# Altium footprint library PCB_CONNECTORS.PcbLib: 676 footprints (part 6 of 43)
Each footprint in its own frame and in the unit in brackets; x right, y up, seen from the top. Pads: shape width x height; smd on the part's side, far side on the other; paste and mask are expansions set on the pad; w line width, h text height; cw(c..) or ccw(c..) is an arc to the next point about the centre after c.
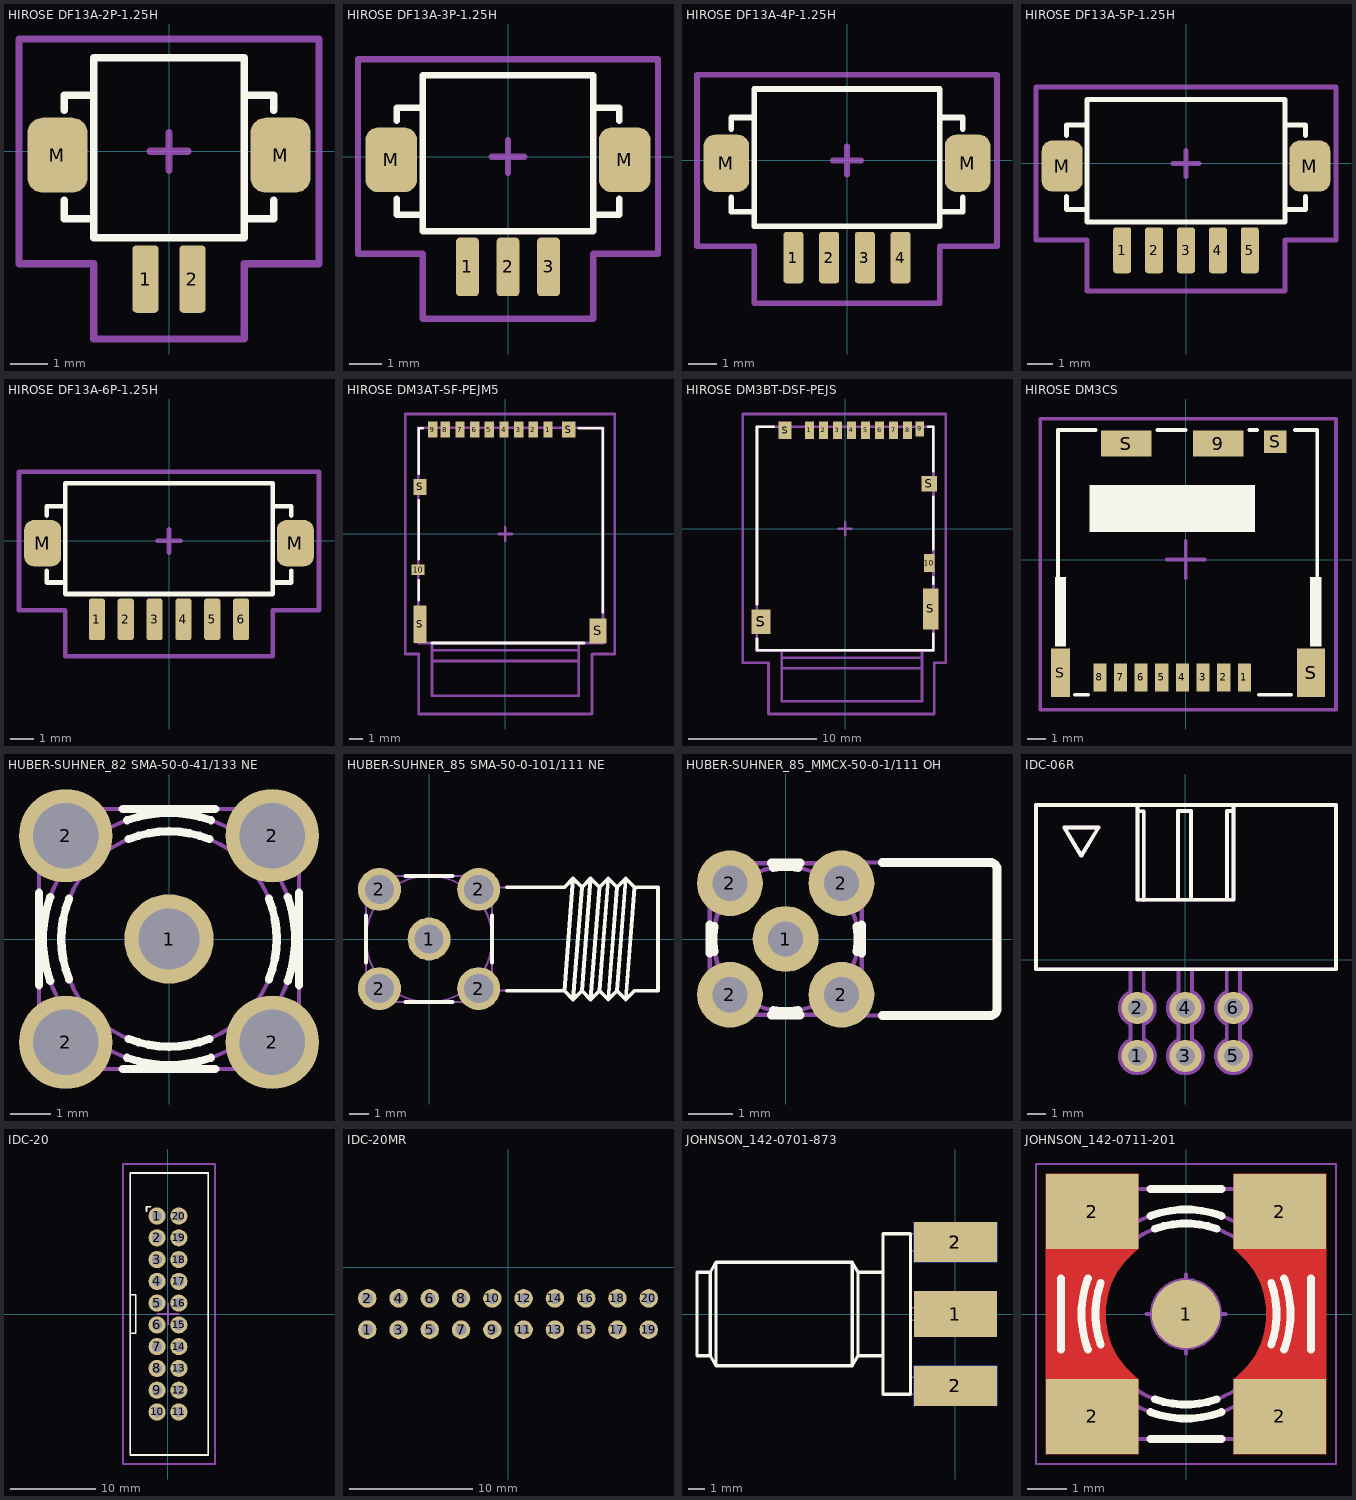
[diagram p5: the footprints below, top view; thin cyan lines are the x and y axes]

## HIROSE DF13A-2P-1.25H [mm] "DF13 Series 1.25mm pitch miniature crimping connector single row"
height 3.6
pads (4):
  rrect30% 0.7x1.8 smd: 1(-0.625,-3.4) 2(0.625,-3.4)
  rrect50% 1.6x2 smd: M(-2.975,-0.1) M(2.975,-0.1)
Top Overlay:
  lines w0.2: -2.8,-1.3 -2.8,-1.8 -2.4,-1.8 -2,-1.8 ; -2.8,1.1 -2.8,1.5 -2,1.5 ; 2,-1.9 2,-1.8 2.4,-1.8 2.8,-1.8 2.8,-1.3 ; 2,1.5 2.8,1.5 2.8,1.1 ; -2,-2.3 -2,-1.3 -2,2.5 0,2.5 2,2.5 2,-1.3 2,-2.3 1,-2.3 0,-2.3 -1,-2.3 -2,-2.3
Mechanical 15:
  lines w0.2: -0.5,0 0.5,0 ; 0,-0.5 0,0.5 ; -4,-3 -2,-3 -2,-5 0,-5 2,-5 2,-3 4,-3 4,2.5 4,3 0,3 -4,3 -4,2.5 -4,-3
3D body "DF13-2P-1.25H_X_8A_S_H_X_97_S__.STEP": height 3.59, standoff -0.01, extent -3.575,-3.9 3.575,2.6

## HIROSE DF13A-3P-1.25H [mm] "DF13 Series 1.25mm pitch miniature crimping connector single row"
height 3.6
pads (5):
  rrect30% 0.7x1.8 smd: 1(-1.25,-3.4) 2(0,-3.4) 3(1.25,-3.4)
  rrect50% 1.6x2 smd: M(-3.6,-0.1) M(3.6,-0.1)
Top Overlay:
  lines w0.2: -3.425,-1.3 -3.425,-1.8 -3.025,-1.8 -2.625,-1.8 ; -3.425,1.1 -3.425,1.5 -2.625,1.5 ; 2.625,1.5 3.425,1.5 3.425,1.1 ; 3.425,-1.3 3.425,-1.8 3.025,-1.8 2.625,-1.8 ; -2.625,-1.8 -2.625,-1.3 -2.625,2.5 -0.625,2.5 1.375,2.5 2.625,2.5 2.625,-1.3 2.625,-1.8 ; -2.625,-1.8 -2.625,-2.3 -1.625,-2.3 -0.625,-2.3 0,-2.3 0.625,-2.3 1.625,-2.3 2.625,-2.3 2.625,-1.8
Mechanical 15:
  lines w0.2: -0.5,0 0.5,0 ; 0,-0.5 0,0.5 ; -4.625,-3 -2.625,-3 -2.625,-5 -0.625,-5 2.625,-5 2.625,-3 4.625,-3 4.625,2.5 4.625,3 3.375,3 -0.625,3 -4.625,3 -4.625,2.5 -4.625,-3
3D body "DF13-3P-1.25H_X_8A_S_H_X_97_S__.STEP": height 3.59, standoff -0.01, extent -4.2,-3.9 4.2,2.6

## HIROSE DF13A-4P-1.25H [mm] "DF13 Series 1.25mm pitch miniature crimping connector single row"
height 3.6
pads (6):
  rrect30% 0.7x1.8 smd: 1(-1.875,-3.4) 2(-0.625,-3.4) 3(0.625,-3.4) 4(1.875,-3.4)
  rrect50% 1.6x2 smd: M(-4.225,-0.1) M(4.225,-0.1)
Top Overlay:
  lines w0.2: -4.05,-1.3 -4.05,-1.8 -3.65,-1.8 -3.25,-1.8 ; -4.05,1.1 -4.05,1.5 -3.25,1.5 ; 3.25,1.5 4.05,1.5 4.05,1.1 ; 4.05,-1.3 4.05,-1.8 3.65,-1.8 3.25,-1.8 ; -3.25,-1.8 -3.25,-1.3 -3.25,2.5 -1.25,2.5 2,2.5 3.25,2.5 3.25,-1.3 3.25,-1.8 ; -3.25,-1.8 -3.25,-2.3 -2.25,-2.3 -1.25,-2.3 -0.625,-2.3 1.25,-2.3 2.25,-2.3 3.25,-2.3 3.25,-1.8
Mechanical 15:
  lines w0.2: -0.5,0 0.5,0 ; 0,-0.5 0,0.5 ; -5.25,-3 -5.25,2.5 -5.25,3 -1.25,3 4,3 5.25,3 5.25,2.5 5.25,-3 3.25,-3 3.25,-5 -1.25,-5 -3.25,-5 -3.25,-3 -5.25,-3
3D body "DF13A-4P-1.25H_X_8A_S_H_X_97_S__.STEP": height 3.59, standoff -0.01, extent -4.825,-3.9 4.825,2.6

## HIROSE DF13A-5P-1.25H [mm] "DF13 Series 1.25mm pitch miniature crimping connector single row"
height 3.6
pads (7):
  rrect30% 0.7x1.8 smd: 1(-2.5,-3.4) 2(-1.25,-3.4) 3(0,-3.4) 4(1.25,-3.4) 5(2.5,-3.4)
  rrect50% 1.6x2 smd: M(-4.85,-0.1) M(4.85,-0.1)
Top Overlay:
  lines w0.2: -4.675,-1.3 -4.675,-1.8 -4.275,-1.8 -3.875,-1.8 ; -4.675,1.1 -4.675,1.5 -3.875,1.5 ; 3.875,1.5 4.675,1.5 4.675,1.1 ; 4.675,-1.3 4.675,-1.8 4.275,-1.8 3.875,-1.8 ; -3.875,-1.8 -3.875,-2.3 -2.875,-2.3 -1.875,-2.3 -1.25,-2.3 1.875,-2.3 2.875,-2.3 3.875,-2.3 3.875,-1.8 ; -3.875,-1.8 -3.875,-1.3 -3.875,2.5 -1.875,2.5 2.625,2.5 3.875,2.5 3.875,-1.3 3.875,-1.8
Mechanical 15:
  lines w0.2: -0.5,0 0.5,0 ; 0,-0.5 0,0.5 ; -5.875,-3 -3.875,-3 -3.875,-5 -1.875,-5 3.875,-5 3.875,-3 5.875,-3 5.875,2.5 5.875,3 4.625,3 -1.875,3 -5.875,3 -5.875,2.5 -5.875,-3
3D body "DF13A-5P-1.25H_X_8A_S_H_X_97_S__.STEP": height 3.59, standoff -0.01, extent -5.45,-3.9 5.45,2.6

## HIROSE DF13A-6P-1.25H [mm] "DF13 Series 1.25mm pitch miniature crimping connector single row"
height 3.6
pads (8):
  rrect30% 0.7x1.8 smd: 1(-3.125,-3.4) 2(-1.875,-3.4) 3(-0.625,-3.4) 4(0.625,-3.4) 5(1.875,-3.4) 6(3.125,-3.4)
  rrect50% 1.6x2 smd: M(-5.475,-0.1) M(5.475,-0.1)
Top Overlay:
  lines w0.2: -5.3,-1.3 -5.3,-1.8 -4.9,-1.8 -4.5,-1.8 ; -5.3,1.1 -5.3,1.5 -4.5,1.5 ; 4.5,-1.8 4.9,-1.8 5.3,-1.8 5.3,-1.3 ; 4.5,1.5 5.3,1.5 5.3,1.1 ; -4.5,-2.3 -4.5,-1.3 -4.5,2.5 -2.5,2.5 3.25,2.5 4.5,2.5 4.5,-1.3 4.5,-2.3 3.5,-2.3 1.8,-2.3 -1.875,-2.3 -2.5,-2.3 -3.5,-2.3 -4.5,-2.3
Mechanical 15:
  lines w0.2: -0.5,0 0.5,0 ; 0,-0.5 0,0.5 ; -6.5,-3 -6.5,2.5 -6.5,3 -2.5,3 5.25,3 6.5,3 6.5,2.5 6.5,-3 4.5,-3 4.5,-5 -2.5,-5 -4.5,-5 -4.5,-3 -6.5,-3
3D body "DF13A-6P-1.25H_X_8A_S_H_X_97_S__.STEP": height 3.59, standoff -0.01, extent -6.075,-3.9 6.075,2.6

## HIROSE DM3AT-SF-PEJM5 [mm]
height 1.68
pads (14):
  rect 0.7x1.2 smd: 1(3.2,7.825) 2(2.1,7.825) 3(1,7.825) 4(-0.1,7.825) 5(-1.2,7.825) 6(-2.3,7.825) 7(-3.4,7.825) 8(-4.5,7.825) 9(-5.45,7.825)
  rect 1x0.8 smd: 10(-6.55,-2.675)
  rect 1x2.8 smd: S(-6.4,-6.775)
  rect 1x1.2 smd: S(-6.4,3.525) S(4.75,7.825)
  rect 1.3x1.9 smd: S(6.95,-7.275)
Top Overlay:
  lines w0.2: -6.5,-4.975 -6.5,-3.475 ; -6.5,-1.875 -6.5,2.525 ; -6.5,4.525 -6.5,7.925 -6.2,7.925 ; -5.5,-8.175 5.9,-8.175 ; 5.5,7.925 7.3,7.925 7.3,-5.875
Mechanical 13:
  lines w0.2: -5.5,-8.725 5.5,-8.725 ; -5.5,-8.175 -5.5,-9.525 ; 5.5,-8.175 5.5,-9.525 ; -5.5,-9.525 -5.5,-12.125 5.5,-12.125 5.5,-9.525 ; -5.5,-9.525 5.5,-9.525 ; -6.525,-8.175 -6.525,7.975 7.325,7.975 7.325,-8.175 -6.525,-8.175
Mechanical 15:
  lines w0.2: -0.5,0 0.5,0 ; 0,-0.5 0,0.5 ; -7.5,-9 -6.5,-9 -6.5,-13.5 6.5,-13.5 6.5,-9 8.2,-9 8.2,-8 8.2,9 -7.5,9 -7.5,-8.5 -7.5,-9
3D body "Hirose DM3AT-SF-PEJM5.STEP": height 1.68, standoff 0, extent -6.525,-8.175 7.325,7.975

## HIROSE DM3BT-DSF-PEJS [mm]
height 2.38
pads (14):
  rect 0.7x1.4 smd: 1(-2.8,7.725) 2(-1.7,7.725) 3(-0.6,7.725) 4(0.5,7.725) 5(1.6,7.725) 6(2.7,7.725) 7(3.8,7.725) 8(4.9,7.725)
  rect 0.7x1.2 smd: 9(5.85,7.825)
  rect 0.8x1.4 smd: 10(6.6,-2.675)
  rect 1.5x1.9 smd: S(-6.6,-7.275)
  rect 1x1.4 smd: S(-4.7,7.725)
  rect 1.2x1.2 smd: S(6.6,3.525)
  rect 1.2x3.2 smd: S(6.7,-6.275)
Top Overlay:
  lines w0.2: -6.9,-8.6 -6.9,-9.5 6.9,-9.5 6.9,-8.2 ; -6.9,-5.9 -6.9,8 -5.6,8 ; 6.5,8 6.9,8 6.9,4.5 ; 6.9,-4.3 6.9,-3.8 ; 6.9,-1.6 6.9,2.5
Mechanical 13:
  lines w0.2: -4.975,-10.1 6.025,-10.1 ; -4.975,-9.55 -4.975,-10.9 ; 6.025,-9.55 6.025,-10.9 ; -4.975,-10.9 6.025,-10.9 ; -4.975,-10.9 -4.975,-13.5 6.025,-13.5 6.025,-10.9 ; -6.925,-9.55 6.925,-9.55 6.925,8 -6.925,8 -6.925,-9.55
Mechanical 15:
  lines w0.2: -0.5,0 0.5,0 ; 0,-0.5 0,0.5 ; -8,-10.5 -6,-10.5 -6,-14.5 7,-14.5 7,-10.5 7.9,-10.5 7.9,9 -8,9 -8,-10.5
3D body "Hirose DM3BT-DSF-PEJS.STEP": height 1.83, standoff 0, extent -6.925,-9.55 6.925,8

## HIROSE DM3CS [mm]
height 1.83
pads (13):
  rect 0.7x1.5 smd: 1(3.125,-6.275) 2(2.025,-6.275) 3(0.925,-6.275) 4(-0.175,-6.275) 5(-1.275,-6.275) 6(-2.375,-6.275) 7(-3.475,-6.275) 8(-4.575,-6.275)
  rect 2.7x1.4 smd: 9(1.725,6.175) S(-3.175,6.175)
  rect 1x2.6 smd: S(-6.675,-6.025)
  rect 1.2x1.2 smd: S(4.775,6.275)
  rect 1.5x2.6 smd: S(6.675,-6.025)
Top Overlay:
  rectangle: 6.625,-4.625 7.225,-0.925
  rectangle: -6.975,-4.625 -6.375,-0.925
  rectangle: -5.125,1.475 3.675,3.975
  lines w0.2: -6.7,-4.4 -6.8,-4.3 -6.8,6.9 -4.8,6.9 ; -5.9,-7.2 -5.2,-7.2 ; -1.5,6.9 0,6.9 ; 3.4,6.9 3.8,6.9 ; 3.9,-7.2 5.6,-7.2 ; 5.8,6.9 7,6.9 7,-4.4
Mechanical 15:
  lines w0.2: -1,0 1,0 ; 0,-1 0,1 ; -7.75,-8 -7.75,7.5 8,7.5 8,-8 -7.75,-8
3D body "Hirose DM3CS-SF.STEP": height 1.93, standoff 0, extent -6.8,-7.2 7,6.9

## HUBER-SUHNER_82 SMA-50-0-41/133 NE [mm] "50 Ohm SMA Straight PCB Jack"
height 9.5
pads (5):
  round 2.2 hole 1.5: 1(0,0)
  round 2.3 hole 1.6: 2(-2.54,-2.54) 2(-2.54,2.54) 2(2.54,-2.54) 2(2.54,2.54)
Top Overlay:
  lines w0.2: -3.2,-1.138 -3.2,1.138 ; -2.921,-1.038 cw(c0,0) -2.921,1.038 ; -2.457,-0.992 cw(c0,0) -2.457,0.992 ; -1.138,-3.2 1.138,-3.2 ; -1.138,3.2 1.138,3.2 ; -1.038,-2.921 ccw(c0,0) 1.038,-2.921 ; -1.038,2.921 cw(c0,0) 1.038,2.921 ; -0.992,-2.457 ccw(c0,0) 0.992,-2.457 ; -0.992,2.457 cw(c0,0) 0.992,2.457 ; 2.457,-0.992 ccw(c0,0) 2.457,0.992 ; 2.921,-1.038 ccw(c0,0) 2.921,1.038 ; 3.2,-1.138 3.2,1.138
Mechanical 8:
  lines w0.1: -3.54,-2.54 -2.54,-2.54 ; -3.54,2.54 -2.54,2.54 ; -2.54,-3.54 -2.54,-2.54 ; -2.54,-1.54 -2.54,-2.54 ; -2.54,1.54 -2.54,2.54 ; -2.54,3.54 -2.54,2.54 ; -1.54,-2.54 -2.54,-2.54 ; -1.54,2.54 -2.54,2.54 ; -1,0 0,0 ; 0,-1 0,0 ; 0,1 0,0 ; 1,0 0,0 ; 1.54,-2.54 2.54,-2.54 ; 1.54,2.54 2.54,2.54 ; 2.54,-3.54 2.54,-2.54 ; 2.54,-1.54 2.54,-2.54 ; 2.54,1.54 2.54,2.54 ; 2.54,3.54 2.54,2.54 ; 3.54,-2.54 2.54,-2.54 ; 3.54,2.54 2.54,2.54
Mechanical 14:
  circle w0.1: c0,0 r0.5
  circle w0.1: c0,0 r2.65
  circle w0.1: c0,0 r3.1
  lines w0.1: -3.2,-3.2 -3.2,3.2 3.2,3.2 3.2,-3.2 -3.2,-3.2
3D body "HUBER-SUHNER_82 SMA-50-0-41-133 NE.stp": height 9.5, standoff -4, extent -3.2,-3.2 3.2,3.2

## HUBER-SUHNER_85 SMA-50-0-101/111 NE [mm] "50 Ohm SMA Right Angle PCB Jack"
height 9.6
pads (5):
  round 2.2 hole 1.5: 1(0,0) 2(-2.54,-2.54) 2(-2.54,2.54) 2(2.54,-2.54) 2(2.54,2.54)
Top Overlay:
  lines w0.2: -3.23,-1.208 -3.23,1.208 ; -1.208,-3.23 1.208,-3.23 ; -1.208,3.23 1.208,3.23 ; 3.23,-1.208 3.23,1.208 ; 4,-2.65 6.93,-2.65 ; 4,2.65 6.93,2.65 7.38,3.1 ; 6.93,-2.65 7.38,3.1 ; 6.93,-2.65 7.38,-3.1 ; 7.38,-3.1 7.83,2.65 ; 7.38,-3.1 7.83,-2.65 ; 7.38,3.1 7.83,2.65 ; 7.83,-2.65 8.28,3.1 ; 7.83,-2.65 8.28,-3.1 ; 7.83,2.65 8.28,3.1 ; 8.28,-3.1 8.73,2.65 ; 8.28,-3.1 8.73,-2.65 ; 8.28,3.1 8.73,2.65 ; 8.73,-2.65 9.18,3.1 ; 8.73,-2.65 9.18,-3.1 ; 8.73,2.65 9.18,3.1 ; 9.18,-3.1 9.63,2.65 ; 9.18,-3.1 9.63,-2.65 ; 9.18,3.1 9.63,2.65 ; 9.63,-2.65 10.08,3.1 ; 9.63,-2.65 10.08,-3.1 ; 9.63,2.65 10.08,3.1 ; 10.08,-3.1 10.53,2.65 ; 10.08,-3.1 10.53,-2.65 11.73,-2.65 11.73,2.65 10.53,2.65 ; 10.08,3.1 10.53,2.65
Mechanical 8:
  lines w0.1: -3.54,-2.54 -2.54,-2.54 ; -3.54,2.54 -2.54,2.54 ; -2.54,-3.54 -2.54,-2.54 ; -2.54,-1.54 -2.54,-2.54 ; -2.54,1.54 -2.54,2.54 ; -2.54,3.54 -2.54,2.54 ; -1.54,-2.54 -2.54,-2.54 ; -1.54,2.54 -2.54,2.54 ; -1,0 0,0 ; 0,-1 0,0 ; 0,1 0,0 ; 1,0 0,0 ; 1.54,-2.54 2.54,-2.54 ; 1.54,2.54 2.54,2.54 ; 2.54,-3.54 2.54,-2.54 ; 2.54,-1.54 2.54,-2.54 ; 2.54,1.54 2.54,2.54 ; 2.54,3.54 2.54,2.54 ; 3.54,-2.54 2.54,-2.54 ; 3.54,2.54 2.54,2.54
Mechanical 14:
  circle w0.1: c0,0 r3.23
  circle w0.1: c0,0 r0.63
  lines w0.1: 2.558,-3.23 3.23,-2.558 ; 3.23,-2.65 6.93,-2.65 ; 3.23,2.65 6.93,2.65 7.38,3.1 ; 6.93,-2.65 7.38,3.1 ; 6.93,-2.65 7.38,-3.1 ; 7.38,-3.1 7.83,2.65 ; 7.38,-3.1 7.83,-2.65 ; 7.38,3.1 7.83,2.65 ; 7.83,-2.65 8.28,3.1 ; 7.83,-2.65 8.28,-3.1 ; 7.83,2.65 8.28,3.1 ; 8.28,-3.1 8.73,2.65 ; 8.28,-3.1 8.73,-2.65 ; 8.28,3.1 8.73,2.65 ; 8.73,-2.65 9.18,3.1 ; 8.73,-2.65 9.18,-3.1 ; 8.73,2.65 9.18,3.1 ; 9.18,-3.1 9.63,2.65 ; 9.18,-3.1 9.63,-2.65 ; 9.18,3.1 9.63,2.65 ; 9.63,-2.65 10.08,3.1 ; 9.63,-2.65 10.08,-3.1 ; 9.63,2.65 10.08,3.1 ; 10.08,-3.1 10.53,2.65 ; 10.08,-3.1 10.53,-2.65 11.73,-2.65 11.73,2.65 10.53,2.65 ; 10.08,3.1 10.53,2.65 ; -3.23,-3.23 3.23,-3.23 3.23,3.23 -3.23,3.23 -3.23,-3.23
3D body "HUBER-SUHNER_85 SMA-50-0-101-111 NE.stp": height 9.6, standoff -4, extent -3.23,-3.23 11.73,3.23

## HUBER-SUHNER_85_MMCX-50-0-1/111 OH [mm] "MMCX 50 Ohm Right Angle PCB Jack"
height 3.8
pads (5):
  round 1.5 hole 0.8: 1(0,0) 2(-1.27,-1.27) 2(-1.27,1.27) 2(1.27,-1.27) 2(1.27,1.27)
Top Overlay:
  lines w0.2: -1.73,-0.326 -1.73,0.326 ; -1.626,-0.282 cw(c0,0) -1.626,0.282 ; -0.326,-1.73 0.326,-1.73 ; -0.326,1.73 0.326,1.73 ; -0.282,-1.626 ccw(c0,0) 0.282,-1.626 ; -0.282,1.626 cw(c0,0) 0.282,1.626 ; 1.626,-0.282 ccw(c0,0) 1.626,0.282 ; 2.208,-1.743 4.665,-1.743 ccw(c4.665,-1.593) 4.815,-1.593 4.815,1.593 ccw(c4.665,1.593) 4.665,1.743 2.208,1.743 ; 1.73,-0.326 1.73,0.326 1.73,-0.326
Mechanical 8:
  lines w0.1: -1.77,-1.27 -1.27,-1.27 ; -1.77,1.27 -1.27,1.27 ; -1.27,-1.77 -1.27,-1.27 ; -1.27,-0.77 -1.27,-1.27 ; -1.27,0.77 -1.27,1.27 ; -1.27,1.77 -1.27,1.27 ; -0.77,-1.27 -1.27,-1.27 ; -0.77,1.27 -1.27,1.27 ; -0.5,0 0,0 ; 0,-0.5 0,0 ; 0,0.5 0,0 ; 0.5,0 0,0 ; 0.77,-1.27 1.27,-1.27 ; 0.77,1.27 1.27,1.27 ; 1.27,-1.77 1.27,-1.27 ; 1.27,-0.77 1.27,-1.27 ; 1.27,0.77 1.27,1.27 ; 1.27,1.77 1.27,1.27 ; 1.77,-1.27 1.27,-1.27 ; 1.77,1.27 1.27,1.27
Mechanical 14:
  circle w0.1: c0,0 r1.65
  lines w0.1: -1.73,-1.73 -1.73,1.73 1.73,1.73 1.73,-1.73 -1.73,-1.73 ; 1.73,-1.743 4.665,-1.743 ccw(c4.665,-1.593) 4.815,-1.593 4.815,1.593 ccw(c4.665,1.593) 4.665,1.743 1.73,1.743 1.73,-1.743
3D body "HUBER-SUHNER_85_MMCX-50-0-1-111 OH.stp": height 3.8, standoff -3, extent -1.73,-1.742 4.815,1.743

## IDC-06R [mm]
pads (6):
  round 1.7 hole 1: 1(-2.54,-5.08) 2(-2.54,-2.54) 3(0,-5.08) 4(0,-2.54) 5(2.54,-5.08) 6(2.54,-2.54)
Top Overlay:
  lines w0.2: -2.9,-0.5 -2.8,-0.5 ; -2.54,7.85 -2.2,7.85 -2.2,3.15 ; -2.54,8.18 -2.54,3.175 2.54,3.175 2.54,8.18 ; -0.4,3.175 -0.4,7.875 0.3,7.875 0.3,3.175 ; -0.36,-0.5 -0.26,-0.5 ; 2.18,-0.5 2.28,-0.5 ; 2.2,3.175 2.2,7.875 2.54,7.875 ; -7.9,8.18 -7.9,8.18 ; -7.9,8.18 -7.9,-0.5 7.96,-0.5 7.96,8.18 -7.9,8.18 ; -6.4,7 -5.5,5.5 -4.6,7 -6.4,7
Mechanical 14:
  lines w0.2: -2.8,-0.5 -2.9,-0.5 -2.9,-5.2 -2.2,-5.2 -2.2,-0.5 ; -2.54,7.85 -2.2,7.85 -2.2,3.15 ; -2.54,8.18 -2.54,3.175 2.54,3.175 2.54,8.18 ; -0.4,3.175 -0.4,7.875 0.3,7.875 0.3,3.175 ; -0.26,-0.5 -0.36,-0.5 -0.36,-5.2 0.34,-5.2 0.34,-0.5 ; 2.2,3.175 2.2,7.875 2.54,7.875 ; 2.28,-0.5 2.18,-0.5 2.18,-5.2 2.88,-5.2 2.88,-0.5 ; -7.9,8.18 7.96,8.18 7.96,-0.5 -7.9,-0.5 -7.9,8.18 ; -7.9,8.18 -7.9,8.18 ; -6.4,7 -4.6,7 -5.5,5.5 -6.4,7
  lines w0.254: -2.964,-4.288 ccw(c-2.54,-5.08) -2.116,-4.288 ; -2.964,-3.332 cw(c-2.54,-2.54) -2.964,-1.748 ; -2.116,-3.332 ccw(c-2.54,-2.54) -2.116,-1.748 ; -0.424,-4.288 ccw(c0,-5.08) 0.424,-4.288 ; -0.424,-3.332 cw(c0,-2.54) -0.424,-1.748 ; 0.424,-3.332 ccw(c0,-2.54) 0.424,-1.748 ; 2.116,-4.288 ccw(c2.54,-5.08) 2.964,-4.288 ; 2.116,-3.332 cw(c2.54,-2.54) 2.116,-1.748 ; 2.964,-3.332 ccw(c2.54,-2.54) 2.964,-1.748
  text ".Designator" at -5.9,0.7 h2.5
  text ".Comment" at -3.3,-0.3 h2
3D body "User Library-IDC Socket Male 6pin Angled THT Goldplated 2_54mm.STEP": height 8.98, standoff -2.37, extent -7.9,-5.38 7.96,8.18

## IDC-20 [mm]
height 9.1
pads (20):
  round 2 hole 1.2: 1(-1.27,11.43) 2(-1.27,8.89) 3(-1.27,6.35) 4(-1.27,3.81) 5(-1.27,1.27) 6(-1.27,-1.27) 7(-1.27,-3.81) 8(-1.27,-6.35) 9(-1.27,-8.89) 10(-1.27,-11.43) 11(1.27,-11.43) 12(1.27,-8.89) 13(1.27,-6.35) 14(1.27,-3.81) 15(1.27,-1.27) 16(1.27,1.27) 17(1.27,3.81) 18(1.27,6.35) 19(1.27,8.89) 20(1.27,11.43)
Top Overlay:
  lines w0.2: -4.4,-2.25 -3.75,-2.25 -3.75,2.25 -4.4,2.25 ; -2.5,12 -2.5,12.5 -2,12.5 ; -4.4,-16.45 4.7,-16.45 4.7,16.45 -4.4,16.45 -4.4,-16.45
Mechanical 1:
  lines w0.2: -4.4,-16.45 -4.4,16.45 4.7,16.45 4.7,-16.45 -4.4,-16.45
Mechanical 15:
  lines w0.2: -1.25,0 1.25,0 ; 0,-1.25 0,1.25 ; -5.25,-17.5 5.5,-17.5 5.5,17.5 -5.25,17.5 -5.25,-17.5
3D body "2x10 2.54mm Box Header.STEP": height 9.1, standoff -3, extent -4.4,-16.45 4.7,16.45

## IDC-20MR [mm]
pads (20):
  round 1.5 hole 0.9: 1(-11.43,-5.08) 2(-11.43,-2.54) 3(-8.89,-5.08) 4(-8.89,-2.54) 5(-6.35,-5.08) 6(-6.35,-2.54) 7(-3.81,-5.08) 8(-3.81,-2.54) 9(-1.27,-5.08) 10(-1.27,-2.54) 11(1.27,-5.08) 12(1.27,-2.54) 13(3.81,-5.08) 14(3.81,-2.54) 15(6.35,-5.08) 16(6.35,-2.54) 17(8.89,-5.08) 18(8.89,-2.54) 19(11.43,-5.08) 20(11.43,-2.54)
3D body "User Library-DS1013-20R (IDC-20R CONNFLY).step": height 8.9, standoff -3, extent -16.6,-5.4 16.6,8.62

## JOHNSON_142-0701-873 [mm] "SMA End Launch Straight Bulkhead Jack Receptacle - Round Contact"
height 8.05
pads (5):
  rect 5x2.794 smd: 1(0,0)
  rect 5x2.4 smd: 2(0,-4.317) 2(0,4.317)
  rect 5x2.4 smd far side: 2(0,-4.317) 2(0,4.317)
Top Overlay:
  lines w0.2: -14.73,-2.5 -15.526,-2.5 -15.526,2.5 -14.73,2.5 ; -5.85,-2.5 -4.35,-2.5 ; -5.85,2.5 -4.35,2.5 ; -14.38,-3.11 -6.2,-3.11 ; -14.38,-3.11 -14.73,-2.51 -14.73,2.51 -14.38,3.11 ; -14.38,-3.11 -14.38,3.11 ; -14.38,3.11 -6.2,3.11 ; -6.2,-3.11 -5.85,-2.51 -5.85,2.51 -6.2,3.11 ; -6.2,-3.11 -6.2,3.11 ; -4.35,-4.825 -4.35,4.825 -2.7,4.825 -2.7,-4.825 -4.35,-4.825
Mechanical 8:
  lines w0.1: -1,-4.317 0,-4.317 ; -1,0 0,0 ; -1,4.317 0,4.317 ; 0,-5.317 0,-4.317 ; 0,-3.317 0,-4.317 ; 0,-1 0,0 ; 0,1 0,0 ; 0,3.317 0,4.317 ; 0,5.317 0,4.317 ; 1,-4.317 0,-4.317 ; 1,0 0,0 ; 1,4.317 0,4.317
Mechanical 14:
  lines w0.1: -14.73,-2.5 -15.526,-2.5 -15.526,2.5 -14.73,2.5 ; -5.85,-2.5 -4.35,-2.5 ; -5.85,2.5 -4.35,2.5 ; -2.7,-3.809 2.05,-3.809 2.05,-4.825 -2.7,-4.825 ; -2.7,-0.381 2.054,-0.381 2.054,0.381 -2.696,0.381 ; -2.7,3.809 2.05,3.809 2.05,4.825 -2.7,4.825 ; -14.38,-3.11 -6.2,-3.11 ; -14.38,-3.11 -14.73,-2.51 -14.73,2.51 -14.38,3.11 ; -14.38,-3.11 -14.38,3.11 ; -14.38,3.11 -6.2,3.11 ; -6.2,-3.11 -5.85,-2.51 -5.85,2.51 -6.2,3.11 ; -6.2,-3.11 -6.2,3.11 ; -2.7,-4.825 -4.35,-4.825 -4.35,4.825 -2.7,4.825 ; -2.7,-4.825 -2.7,4.825
3D body "JOHNSON_142-0701-873_Part1.stp": height 4.48, standoff -3.57, extent -15.526,-4.825 2.054,4.825
3D body "JOHNSON_142-0701-873_Part2.stp": height 5.56, standoff -4.64, extent -8.57,-5.1 -6.35,5.1

## JOHNSON_142-0711-201 [mm] "SMA 50 Ohm Straight Jack Receptacle - Surface Mount"
height 8.84
pads (5):
  round 1.73 smd: 1(0,0)
  rect 2.35x1.9 smd: 2(-2.38,-2.6) 2(-2.38,2.6) 2(2.38,-2.6) 2(2.38,2.6)
Top Layer:
  region: -3.555,-3.555 -1.205,-3.555 -1.205,-1.652 -1.331,-1.553 -1.557,-1.326 -1.745,-1.067 -1.89,-0.781 -1.989,-0.476 -2.039,-0.16 -2.039,0.16 -1.989,0.476 -1.89,0.781 -1.745,1.067 -1.557,1.326 -1.331,1.553 -1.205,1.652 -1.205,3.555 -3.555,3.555
  region: 1.205,-3.555 3.555,-3.555 3.555,3.555 1.205,3.555 1.205,1.652 1.331,1.553 1.557,1.326 1.745,1.067 1.89,0.781 1.989,0.476 2.039,0.16 2.039,-0.16 1.989,-0.476 1.89,-0.781 1.745,-1.067 1.557,-1.326 1.331,-1.553 1.205,-1.652
Top Overlay:
  lines w0.2: -3.175,-0.905 -3.175,0.905 ; -2.491,-0.905 cw(c0,0) -2.491,0.905 ; -2.162,-0.78 cw(c0,0.005) -2.162,0.79 ; -0.905,-3.175 0.905,-3.175 ; -0.905,-2.491 ccw(c0,0) 0.905,-2.491 ; -0.905,2.491 cw(c0,0) 0.905,2.491 ; -0.905,3.175 0.905,3.175 ; -0.79,-2.162 ccw(c-0.005,0) 0.78,-2.162 ; -0.79,2.162 cw(c-0.005,0) 0.78,2.162 ; 2.162,-0.78 ccw(c0,0.005) 2.162,0.79 ; 2.491,-0.905 ccw(c0,0) 2.491,0.905 ; 3.175,-0.905 3.175,0.905
Top Solder:
  region: 1.105,1.601 1.176,1.549 1.312,1.436 1.436,1.312 1.549,1.176 1.601,1.105 3.655,1.105 3.655,3.655 1.105,3.655
  region: -3.655,1.105 -1.601,1.105 -1.549,1.176 -1.436,1.312 -1.312,1.436 -1.176,1.549 -1.105,1.601 -1.105,3.655 -3.655,3.655
  region: 1.105,-3.655 1.105,-1.601 1.176,-1.549 1.312,-1.436 1.436,-1.312 1.549,-1.176 1.601,-1.105 3.655,-1.105 3.655,-3.655
  region: -3.655,-3.655 -3.655,-1.105 -1.601,-1.105 -1.549,-1.176 -1.436,-1.312 -1.312,-1.436 -1.176,-1.549 -1.105,-1.601 -1.105,-3.655
Mechanical 8:
  lines w0.1: -3.38,-2.38 -2.38,-2.38 ; -3.38,2.38 -2.38,2.38 ; -2.38,-3.38 -2.38,-2.38 ; -2.38,-1.38 -2.38,-2.38 ; -2.38,1.38 -2.38,2.38 ; -2.38,3.38 -2.38,2.38 ; -1.38,-2.38 -2.38,-2.38 ; -1.38,2.38 -2.38,2.38 ; -1,0 0,0 ; 0,-1 0,0 ; 0,1 0,0 ; 1,0 0,0 ; 1.38,-2.38 2.38,-2.38 ; 1.38,2.38 2.38,2.38 ; 2.38,-3.38 2.38,-2.38 ; 2.38,-1.38 2.38,-2.38 ; 2.38,1.38 2.38,2.38 ; 2.38,3.38 2.38,2.38 ; 3.38,-2.38 2.38,-2.38 ; 3.38,2.38 2.38,2.38 ; -3.175,-3.175 -1.585,-3.175 -1.585,-1.585 -3.175,-1.585 -3.175,-3.175 ; -3.175,1.585 -1.585,1.585 -1.585,3.175 -3.175,3.175 -3.175,1.585 ; 1.585,-3.175 1.585,-1.585 3.175,-1.585 3.175,-3.175 1.585,-3.175 ; 1.585,1.585 1.585,3.175 3.175,3.175 3.175,1.585 1.585,1.585
Mechanical 14:
  circle w0.1: c0,0 r2.3
  circle w0.1: c0,0 r2.65
  circle w0.1: c0,0 r0.635
  lines w0.1: 3.175,-3.175 3.175,3.175 ; 3.175,-3.175 3.175,3.175 ; 3.175,-3.175 -3.175,-3.175 -3.175,3.175 3.175,3.175
Mechanical 15:
  circle w0.1: c0,0 r0.865
  lines w0.05: -3.805,-3.805 3.805,-3.805 3.805,3.805 -3.805,3.805 -3.805,-3.805
3D body "JOHNSON_142-0711-201.stp": height 8.84, standoff 0, extent -3.175,-3.175 3.175,3.175